# Altium footprint library Modules.PcbLib: 18 footprints (part 1 of 2)
Each footprint in its own frame and in the unit in brackets; x right, y up, seen from the top. Pads: shape width x height; smd on the part's side, far side on the other; paste and mask are expansions set on the pad; w line width, h text height; cw(c..) or ccw(c..) is an arc to the next point about the centre after c.
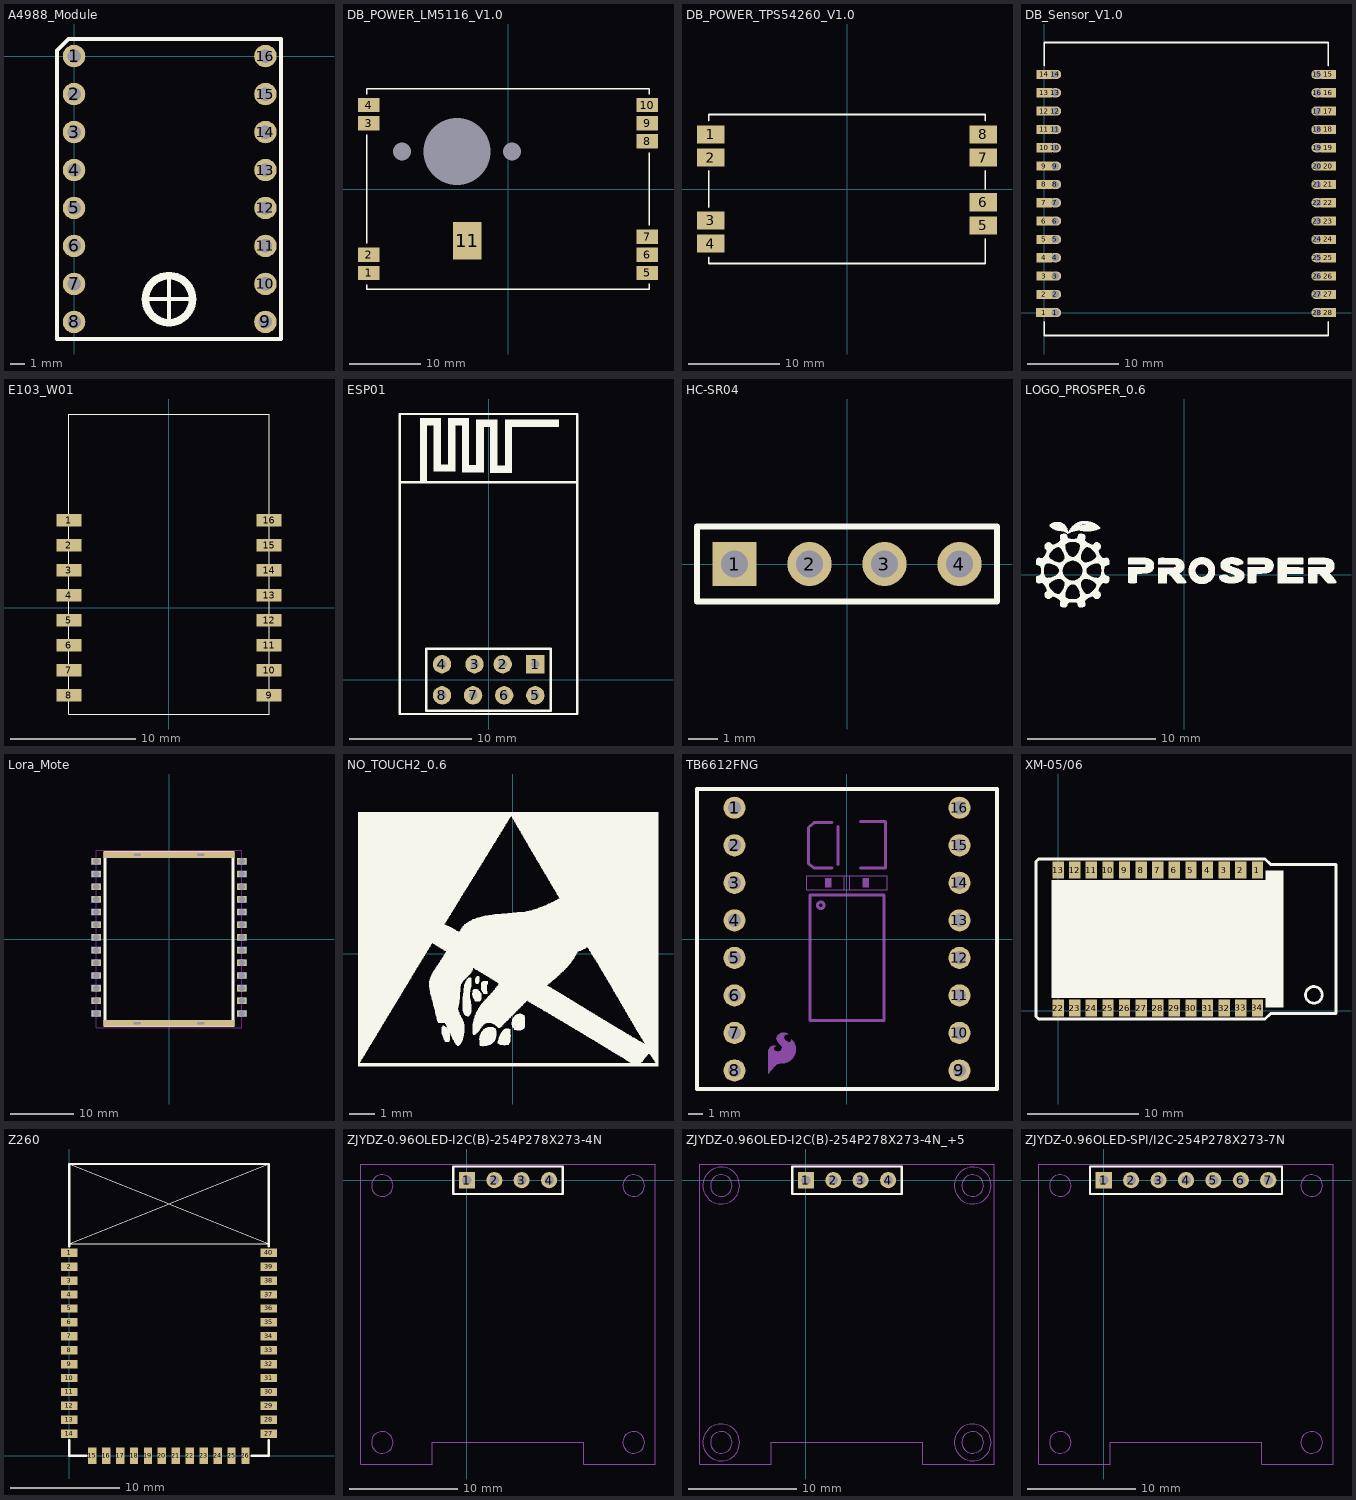
[diagram p0: the footprints below, top view; thin cyan lines are the x and y axes]

## A4988_Module [mm] "A4988 Stepper Motor Driver Carrier board, DMOS Microstepping Driver with Translator and Overcurrent Protection"
pads (16):
  round 1.5 hole 0.9: 1(0,0) 2(0,-2.54) 3(0,-5.08) 4(0,-7.62) 5(0,-10.16) 6(0,-12.7) 7(0,-15.24) 8(0,-17.78) 9(12.8,-17.78) 10(12.8,-15.24) 11(12.8,-12.7) 12(12.8,-10.16) 13(12.8,-7.62) 14(12.8,-5.08) 15(12.8,-2.54) 16(12.8,0)
Top Overlay:
  circle w0.508: c6.35,-16.256 r1.571
  lines w0.254: 4.826,-16.256 7.921,-16.256 ; 6.35,-17.78 6.35,-14.732 ; -1.143,-18.923 -1.143,0.381 -0.381,1.143 13.843,1.143 13.843,-18.923 -1.143,-18.923
  text "." at -1.524,1.016 h2.54
3D body "stepstick.X_T": height 9.9, standoff -6.14, extent -1.27,-19.05 13.97,1.27

## DB_POWER_LM5116_V1.0 [mm]
pads (14):
  rect 0x0 hole 2.5 unplated paste+0: 0(-14.85,5.25) 0(0.55,5.25)
  rect 0x0 hole 9.4 square unplated paste+0: 0(-7.15,5.25)
  rect 3x2 smd paste+0: 1(-19.5,-11.75) 2(-19.5,-9.21) 3(-19.5,9.21) 4(-19.5,11.75) 5(19.5,-11.75) 6(19.5,-9.21) 7(19.5,-6.67) 8(19.5,6.67) 9(19.5,9.21) 10(19.5,11.75)
  rect 4x5.3 smd paste+0: 11(-5.7,-7.25)
Top Overlay:
  lines w0.2: -19.8,-13.4 -19.8,-14 19.8,-14 19.8,-13.3 ; -19.8,-7.6 -19.8,7.6 ; -19.8,13.3 -19.8,14 19.8,14 19.8,13.3 ; 19.8,-5.1 19.8,5.1
3D body "DB_Power_LM5116_V1.0.step": height 17.51, standoff -6.35, extent -19.5,-13.75 19.5,13.75

## DB_POWER_TPS54260_V1.0 [mm]
pads (8):
  rect 3x2 smd paste+0: 1(-15,6) 2(-15,3.46) 3(-15,-3.46) 4(-15,-6) 5(15,-4) 6(15,-1.46) 7(15,3.46) 8(15,6)
Top Overlay:
  lines w0.2: -15.2,-7.5 -15.2,-8.2 15.2,-8.2 15.2,-5.5 ; -15.2,-2 -15.2,2 ; -15.2,7.5 -15.2,8.2 15.2,8.2 15.2,7.5 ; 15.2,0 15.2,2
3D body "DB_POWER_TPS54260_V1.0.step": height 9.1, standoff 0.1, extent -15,-8 15,8

## DB_Sensor_V1.0 [mm]
pads (56):
  rect 1.8x1 smd paste+0 mask+0.1: 1(0,0)
  oval 1.3x1 hole 0.8 paste+0 mask+0.1: 1(1.2,0) 2(1.2,2) 3(1.2,4) 4(1.2,6) 5(1.2,8) 6(1.2,10) 7(1.2,12) 8(1.2,14) 9(1.2,16) 10(1.2,18) 11(1.2,20) 12(1.2,22) 13(1.2,24) 14(1.2,26) 15(29.8,26) 16(29.8,24) 17(29.8,22) 18(29.8,20) 19(29.8,18) 20(29.8,16) 21(29.8,14) 22(29.8,12) 23(29.8,10) 24(29.8,8) 25(29.8,6) 26(29.8,4) 27(29.8,2) 28(29.8,0)
  rect 1.7x1 smd paste+0 mask+0.1: 2(0,2) 3(0,4) 4(0,6) 5(0,8) 6(0,10) 7(0,12) 8(0,14) 9(0,16) 10(0,18) 11(0,20) 12(0,22) 13(0,24) 14(0,26) 15(31,26) 16(31,24) 17(31,22) 18(31,20) 19(31,18) 20(31,16) 21(31,14) 22(31,12) 23(31,10) 24(31,8) 25(31,6) 26(31,4) 27(31,2) 28(31,0)
Top Overlay:
  lines w0.2: 0,-1 0,-2.5 31,-2.5 31,-1 ; 0,27 0,29.5 31,29.5 31,27
3D body "DB_Sensor_V1.0.step": height 4.41, standoff 0, extent 0,-2.5 31,29.5

## E103_W01 [mm]
pads (16):
  rect 2x1 smd: 1(-8,7) 2(-8,5) 3(-8,3) 4(-8,1) 5(-8,-1) 6(-8,-3) 7(-8,-5) 8(-8,-7) 9(8,-7) 10(8,-5) 11(8,-3) 12(8,-1) 13(8,1) 14(8,3) 15(8,5) 16(8,7)
Top Overlay:
  lines w0.1: -8,-8.5 8,-8.5 8,15.5 -8,15.5 -8,-8.5
3D body: height 3, standoff 1.6, extent -6.7,-7.5 6.6,9.7
3D body: height 1.6, standoff 0, extent -8,-8.5 8,15.5

## ESP01 [mm] "ESP8266 WIFI模块"
pads (8):
  rect 1.5x1.5 hole 0.7: 1(3.81,1.27)
  round 1.5 hole 0.7: 2(1.15,1.27) 3(-1.15,1.27) 4(-3.81,1.27) 5(3.81,-1.27) 6(1.27,-1.27) 7(-1.27,-1.27) 8(-3.81,-1.27)
Top Overlay:
  rectangle: -5.599,16.129 -5.015,21.361
  rectangle: -5.015,20.777 -3.897,21.361
  rectangle: -4.507,17.018 -3.897,20.777
  rectangle: -3.897,17.018 -2.703,17.602
  rectangle: -3.313,17.602 -2.703,21.361
  rectangle: -2.703,20.777 -1.586,21.361
  rectangle: -2.17,16.942 -1.586,20.777
  rectangle: -1.586,16.942 -0.392,17.526
  rectangle: -1.027,17.526 -0.392,21.26
  rectangle: -0.392,20.65 0.726,21.26
  rectangle: 0.116,16.891 0.726,20.65
  rectangle: 0.726,16.891 1.919,17.501
  rectangle: 1.335,17.501 1.919,21.26
  rectangle: 1.919,20.65 5.755,21.26
  lines w0.2: -7.25,16.129 7.25,16.129 ; -7.25,-2.794 7.25,-2.794 7.25,21.706 -7.25,21.706 -7.25,-2.794 ; -5.08,-2.54 -5.08,2.54 5.08,2.54 5.08,-2.54 -5.08,-2.54
3D body "User Library-Pin Bar 2X4 2_54mm 11_5mm length.STEP": height 3, standoff -8.5, extent -5.07,-2.6 5.09,2.48

## HC-SR04 [mm] "Ultrasonic module HC-SR04, 2.54mm Pitch, 3Pin, single row, stand off hight:2.4mm"
pads (4):
  rect 1.5x1.5 hole 0.9: 1(-3.81,0)
  round 1.5 hole 0.9: 2(-1.27,0) 3(1.27,0) 4(3.81,0)
Top Overlay:
  lines w0.2: -5.08,-1.27 -5.08,1.27 5.08,1.27 5.08,-1.27 -5.08,-1.27
3D body "超声波.STEP": height 24.5, standoff -2.93, extent -22.75,-4.65 22.75,10.65

## LOGO_PROSPER_0.6 [mm]
Top Overlay:
  drawing of 2512 lines, arcs and shapes, not listed

## Lora_Mote [mm]
pads (84):
  rect 1.5x1 smd: 1(-11.5,12.25) 2(-11.5,10.25) 3(-11.5,8.25) 4(-11.5,6.25) 5(-11.5,4.25) 6(-11.5,2.25) 7(-11.5,0.25) 8(-11.5,-1.75) 9(-11.5,-3.75) 10(-11.5,-5.75) 11(-11.5,-7.75) 12(-11.5,-9.75) 13(-11.5,-11.75) 14(11.5,-11.75) 15(11.5,-9.75) 16(11.5,-7.75) 17(11.5,-5.75) 18(11.5,-3.75) 19(11.5,-1.75) 20(11.5,0.25) 21(11.5,2.25) 22(11.5,4.25) 23(11.5,6.25) 24(11.5,8.25) 25(11.5,10.25) 26(11.5,12.25)
  round 1 hole 1: 1(-11.5,12.25) 2(-11.5,10.25) 3(-11.5,8.25) 4(-11.5,6.25) 5(-11.5,4.25) 6(-11.5,2.25) 7(-11.5,0.25) 8(-11.5,-1.75) 9(-11.5,-3.75) 10(-11.5,-5.75) 11(-11.5,-7.75) 12(-11.5,-9.75) 13(-11.5,-11.75) 14(11.5,-11.75) 15(11.5,-9.75) 16(11.5,-7.75) 17(11.5,-5.75) 18(11.5,-3.75) 19(11.5,-1.75) 20(11.5,0.25) 21(11.5,2.25) 22(11.5,4.25) 23(11.5,6.25) 24(11.5,8.25) 25(11.5,10.25) 26(11.5,12.25)
  rect 1.5x1 smd far side: 1(-11.5,12.25) 2(-11.5,10.25) 3(-11.5,8.25) 4(-11.5,6.25) 5(-11.5,4.25) 6(-11.5,2.25) 7(-11.5,0.25) 8(-11.5,-1.75) 9(-11.5,-3.75) 10(-11.5,-5.75) 11(-11.5,-7.75) 12(-11.5,-9.75) 13(-11.5,-11.75) 14(11.5,-11.75) 15(11.5,-9.75) 16(11.5,-7.75) 17(11.5,-5.75) 18(11.5,-3.75) 19(11.5,-1.75) 20(11.5,0.25) 21(11.5,2.25) 22(11.5,4.25) 23(11.5,6.25) 24(11.5,8.25) 25(11.5,10.25) 26(11.5,12.25)
  rect 0x0 hole 0.3 slot 1.1 at 0 deg: 13(-5,-13.3) 13(5,-13.3) 26(-5,13.3) 26(5,13.3)
  rect 20.75x1 smd: 13(0,-13.3) 26(0,13.3)
Top Overlay:
  lines w0.2: -10.25,-13.75 -10.25,9 -10.25,13.75 10.25,13.75 10.25,-13.75 -10.25,-13.75 ; -10,-13.3 -10,13.3 10,13.3 10,-13.3 -10,-13.3
Bottom Overlay:
  circle w0.254: c-11,13.5 r0.354
  text "NSS" at 10,9.75 h1.02
  text "SWDIO" at -5.252,3.755 h1.02
  text "SWCLK" at -5.226,5.761 h1.02
  text "MOSI" at 10,3.75 h1.02
  text "MISO" at 10,5.75 h1.02
  text "SCK" at 10,7.75 h1.02
  text "SDA" at -7.25,1.75 h1.02
  text "SLK" at -7.25,-0.25 h1.02
  text "RX" at -7.25,-6.25 h1.02
  text "CTS" at -7.25,-8.25 h1.02
  text "RTS" at -7.25,-10.25 h1.02
  text "GND" at -7.25,-12.25 h1.02
  text "VCC" at 10,-12.25 h1.02
  text "GND" at 10,-10.25 h1.02
  text "ANT" at -7.25,9.75 h1.02
  text "GND" at 10,11.75 h1.02
  text "GND" at 10,1.75 h1.02
  text "GND" at -7.25,11.75 h1.02
  text "TX" at -7.25,-4.25 h1.02
  text "CK" at -7.25,-2.25 h1.02
  text "GND" at -7.25,7.75 h1.02
  text "RESET" at 10,-8.25 h1.02
  text "PA0" at 10,-6.25 h1.02
  text "PA1" at 10,-4.25 h1.02
  text "PA2" at 10,-2.25 h1.02
  text "PA3" at 10,-0.25 h1.02
Keep-Out Layer:
  lines w0.127: 11.5,-14 -11.5,-14 -11.5,14 11.5,14 11.5,-13.982

## NO_TOUCH2_0.6 [mm]
Top Overlay:
  drawing of 2215 lines, arcs and shapes, not listed

## TB6612FNG [mm]
pads (16):
  round 1.5 hole 0.9: 1(-7.62,8.897) 2(-7.62,6.355) 3(-7.62,3.813) 4(-7.62,1.271) 5(-7.62,-1.271) 6(-7.62,-3.813) 7(-7.62,-6.355) 8(-7.62,-8.897) 9(7.62,-8.897) 10(7.62,-6.355) 11(7.62,-3.813) 12(7.62,-1.271) 13(7.62,1.271) 14(7.62,3.813) 15(7.62,6.355) 16(7.62,8.897)
Top Overlay:
  lines w0.254: -10.16,-10.152 -10.16,10.168 10.16,10.168 10.16,-10.152 -10.16,-10.152
Mechanical 22:
  drawing of 22 lines, arcs and shapes, not listed
  text "TB6612FNG" at -3.175,-7.485 h0.86
  text "Breakout" at -3.175,-9.009 h0.86
Mechanical 23:
  text "VM" at -4.149,8.542 h0.86
  text "VCC" at -3.286,6.002 h0.86
  text "GND" at -3.286,3.462 h0.86
  text "GND" at -3.286,-9.238 h0.86
  text "GND" at 5.461,-9.39 h0.86
  text "A01" at -3.574,0.922 h0.86
  text "A02" at -3.286,-1.618 h0.86
  text "B02" at -3.286,-4.158 h0.86
  text "B01" at -3.574,-6.698 h0.86
  text "PWMB" at 5.461,-6.85 h0.86
  text "BIN2" at 5.461,-4.31 h0.86
  text "BIN1" at 5.461,-1.77 h0.86
  text "STBY" at 5.461,0.77 h0.86
  text "AIN1" at 5.461,3.31 h0.86
  text "AIN2" at 5.461,5.85 h0.86
  text "PWMA" at 5.461,8.39 h0.86
Mechanical 26:
  region: 1.07,3.518 1.07,4.117 1.47,4.117 1.47,3.518
  region: -1.07,4.117 -1.07,3.518 -1.47,3.518 -1.47,4.117
Mechanical 30:
  lines w0.051: -2.743,3.334 -2.743,4.301 0.203,4.301 0.203,3.334 -2.743,3.334 ; -0.203,3.334 -0.203,4.301 2.743,4.301 2.743,3.334 -0.203,3.334
3D body "HDR1X8_2.54mm.STEP": height 3, standoff -8.54, extent 6.27,-10.127 8.81,10.193
3D body "HDR1X8_2.54mm.STEP": height 3, standoff -8.54, extent -8.97,-10.127 -6.43,10.193
3D body "T1.step": height 0, standoff -0.91, extent -10.22,-10.06 10.1,10.26

## XM-05/06 [mil] "26 pin 1.5mm bluetooth module"
pads (26):
  rect 40x60 smd: 1(708.65,501.02) 2(649.59,501.02) 3(590.54,501.02) 4(531.48,501.02) 5(472.43,501.02) 6(413.37,501.02) 7(354.32,501.02) 8(295.26,501.02) 9(236.21,501.02) 10(177.15,501.02) 11(118.1,501.02) 12(59.04,501.02) 13(-0.01,501.02) 22(-0.01,10.11) 23(59.04,10.11) 24(118.1,10.11) 25(177.15,10.11) 26(236.21,10.11) 27(295.26,10.11) 28(354.32,10.11) 29(413.37,10.11) 30(472.43,10.11) 31(531.48,10.11) 32(590.54,10.11) 33(649.59,11.02) 34(708.65,11.02)
Top Overlay:
  circle w10: c909.45,57.28 r29.53
  rectangle: 737.09,13.02 801.09,47.02
  rectangle: 737.09,466.02 801.09,499.02
  rectangle: -23.91,46.11 801.09,466.11
  lines w10: -69.02,-28.98 -78.74,-19.26 -78.74,531.17 -68.9,541.02 736.09,541.02 756.09,521.02 988.19,521.02 988.19,-8.98 756.09,-8.98 736.09,-28.98 -68.9,-28.98
3D body: height 86.61, standoff 31.5, extent -23.62,39.37 787.4,472.44
3D body: height 31.5, standoff 0, extent -68.9,0 994.09,511.81

## Z260 [mil]
pads (40):
  rect 60x30 smd: 1(0,728.61) 2(0,678.61) 3(0,628.61) 4(0,578.61) 5(0,528.61) 6(0,478.61) 7(0,428.61) 8(0,378.61) 9(0,328.61) 10(0,278.61) 11(0,228.61) 12(0,178.61) 13(0,128.61) 14(0,78.61) 27(716.54,78.61) 28(716.54,128.61) 29(716.54,178.61) 30(716.54,228.61) 31(716.54,278.61) 32(716.54,328.61) 33(716.54,378.61) 34(716.54,428.61) 35(716.54,478.61) 36(716.54,528.61) 37(716.54,578.61) 38(716.54,628.61) 39(716.54,678.61) 40(716.54,728.61)
  rect 30x60 smd: 15(82.82,0) 16(132.82,0) 17(182.82,0) 18(232.82,0) 19(282.82,0) 20(332.82,0) 21(382.82,0) 22(432.82,0) 23(482.82,0) 24(532.82,0) 25(582.82,0) 26(632.82,0)
Top Overlay:
  lines w2: 0,1047.24 716.54,760 0,760 716.54,1047.24
  lines w8: 0,56 0,0 61,0 ; 0,752 0,1047.24 716.54,1047.24 716.54,752 ; 655,0 716.54,0 716.54,56
3D body: height 35, standoff 0, extent 0,0 716.54,1047.24

## ZJYDZ-0.96OLED-I2C(B)-254P278X273-4N [mm]
pads (4):
  rect 1.5x1.5 hole 0.9: 1(0,0)
  round 1.5 hole 0.9: 2(2.54,0) 3(5.08,0) 4(7.62,0)
Top Overlay:
  lines w0.2: -1.27,-1.27 -1.27,1.27 8.89,1.27 8.89,-1.27 -1.27,-1.27
Mechanical 13:
  circle w0.01: c-7.84,-0.5 r1
  circle w0.01: c15.46,-0.5 r1
  circle w0.01: c-7.84,-24.3 r1
  circle w0.01: c15.46,-24.3 r1
  lines w0.01: -9.84,-26.3 -3.19,-26.3 -3.19,-24.3 10.81,-24.3 10.81,-26.3 17.46,-26.3 17.46,1.5 -9.84,1.5 -9.84,-26.3
3D body: height 3.74, standoff 2.54, extent -9.839,-26.299 17.459,1.499
3D body: height 0, standoff 0, extent 14.461,-25.299 16.459,-23.301
3D body: height 0, standoff 0, extent -8.839,-1.499 -6.841,0.499
3D body: height 0, standoff 0, extent -8.839,-25.299 -6.841,-23.301
3D body: height 0, standoff 0, extent 14.461,-1.499 16.459,0.499
3D body "User Library-096OLED.step": height 4.76, standoff 0.92, extent -9.54,-24.987 17.16,-2.77
3D body "HDR1X4_2.54mm.STEP": height 5.54, standoff -6, extent -1.27,-1.27 8.89,1.27

## ZJYDZ-0.96OLED-I2C(B)-254P278X273-4N_+5 [mm] "中景园0.96“OLED,I2C(B),5mmPCB隔离柱"
pads (4):
  rect 1.5x1.5 hole 0.9: 1(0,0)
  round 1.5 hole 0.9: 2(2.54,0) 3(5.08,0) 4(7.62,0)
Top Overlay:
  lines w0.2: -1.27,-1.27 -1.27,1.27 8.89,1.27 8.89,-1.27 -1.27,-1.27
Mechanical 13:
  circle w0.01: c-7.84,-0.5 r1.7
  circle w0.01: c-7.84,-0.5 r1
  circle w0.01: c15.46,-0.5 r1
  circle w0.01: c-7.84,-24.3 r1
  circle w0.01: c15.46,-24.3 r1
  circle w0.01: c15.46,-0.5 r1.7
  circle w0.01: c15.46,-24.3 r1.7
  circle w0.01: c-7.84,-24.3 r1.7
  lines w0.01: -9.84,-26.3 -3.19,-26.3 -3.19,-24.3 10.81,-24.3 10.81,-26.3 17.46,-26.3 17.46,1.5 -9.84,1.5 -9.84,-26.3
3D body: height 6.2, standoff 5, extent -9.839,-26.299 17.459,1.499
3D body: height 0, standoff 0, extent 14.461,-25.299 16.459,-23.301
3D body: height 0, standoff 0, extent -8.839,-1.499 -6.841,0.499
3D body: height 0, standoff 0, extent -8.839,-25.299 -6.841,-23.301
3D body: height 0, standoff 0, extent 14.461,-1.499 16.459,0.499
3D body "User Library-096OLED.step": height 7.52, standoff 3.68, extent -9.54,-24.987 17.16,-2.77
3D body "HDR1X4_2.54mm.STEP": height 8, standoff -3.54, extent -1.27,-1.27 8.89,1.27
3D body: height 5, standoff 0, extent -9.539,-25.999 -6.141,-22.601
3D body: height 6.2, standoff -3.9, extent -8.839,-25.299 -6.841,-23.301
3D body: height 5, standoff 0, extent -9.539,-2.199 -6.141,1.199
3D body: height 6.2, standoff -3.9, extent -8.839,-1.499 -6.841,0.499
3D body: height 5, standoff 0, extent 13.761,-25.999 17.159,-22.601
3D body: height 6.2, standoff -3.9, extent 14.461,-25.299 16.459,-23.301
3D body: height 5, standoff 0, extent 13.761,-2.199 17.159,1.199
3D body: height 6.2, standoff -3.9, extent 14.461,-1.499 16.459,0.499

## ZJYDZ-0.96OLED-SPI/I2C-254P278X273-7N [mm]
pads (7):
  rect 1.5x1.5 hole 0.9: 1(0,0)
  round 1.5 hole 0.9: 2(2.54,0) 3(5.08,0) 4(7.62,0) 5(10.16,0) 6(12.7,0) 7(15.24,0)
Top Overlay:
  lines w0.2: -1.27,-1.27 16.51,-1.27 16.51,1.27 -1.27,1.27 -1.27,-1.27
Mechanical 13:
  circle w0.01: c-4.03,-0.5 r1
  circle w0.01: c19.27,-0.5 r1
  circle w0.01: c-4.03,-24.3 r1
  circle w0.01: c19.27,-24.3 r1
  lines w0.01: -6.03,-26.3 0.62,-26.3 0.62,-24.3 14.62,-24.3 14.62,-26.3 21.27,-26.3 21.27,1.5 -6.03,1.5 -6.03,-26.3
3D body "HDR1X7_2.54mm.STEP": height 5.54, standoff -6, extent -1.27,-1.27 16.51,1.27
3D body: height 3.74, standoff 2.54, extent -6.029,-26.299 21.269,1.499
3D body: height 0, standoff 0, extent 18.271,-25.299 20.269,-23.301
3D body: height 0, standoff 0, extent -5.029,-1.499 -3.031,0.499
3D body: height 0, standoff 0, extent -5.029,-25.299 -3.031,-23.301
3D body: height 0, standoff 0, extent 18.271,-1.499 20.269,0.499
3D body "User Library-096OLED.step": height 4.36, standoff 0.52, extent -5.73,-24.987 20.97,-2.77